# Altium integrated library Connectors.IntLib: 512 symbols (part 1 of 2) (continued)
## PBS-04R
designator CON?  (value not drawn)
2.54mm; Note: Connector; Temp.Characteristic: -40C to +85C; Value: *; Publisher: Catcatcat Electronics; Website developer: http://catcatcat.d-lan.dp.ua/; Assembly type: Manual Part
footprint PBS-04R
pins: 1, 2, 3, 4

## PBS-05
designator CON?  (value not drawn)
2.54mm; Note: Connector; Temp.Characteristic: -40C to +85C; Value: *; Publisher: Catcatcat Electronics; Website developer: http://catcatcat.d-lan.dp.ua/; Assembly type: Manual Part
footprint PBS-05
pins: 1, 2, 3, 4, 5

## PBS-05R
designator CON?  (value not drawn)
2.54mm; Note: Connector; Temp.Characteristic: -40C to +85C; Value: *; Publisher: Catcatcat Electronics; Website developer: http://catcatcat.d-lan.dp.ua/; Assembly type: Manual Part
footprint PBS-05R
pins: 1, 2, 3, 4, 5

## PBS-06
designator CON?  (value not drawn)
2.54mm; Note: Connector; Temp.Characteristic: -40C to +85C; Value: *; Publisher: Catcatcat Electronics; Website developer: http://catcatcat.d-lan.dp.ua/; Assembly type: Manual Part
footprint PBS-06
pins: 1, 2, 3, 4, 5, 6

## PBS-06R
designator CON?  (value not drawn)
2.54mm; Note: Connector; Temp.Characteristic: -40C to +85C; Value: *; Publisher: Catcatcat Electronics; Website developer: http://catcatcat.d-lan.dp.ua/; Assembly type: Manual Part
footprint PBS-06R
pins: 1, 2, 3, 4, 5, 6

## PBS-07
designator CON?  (value not drawn)
2.54mm; Note: Connector; Temp.Characteristic: -40C to +85C; Value: *; Publisher: Catcatcat Electronics; Website developer: http://catcatcat.d-lan.dp.ua/; Assembly type: Manual Part
footprint PBS-07
pins: 1, 2, 3, 4, 5, 6, 7

## PBS-07R
designator CON?  (value not drawn)
2.54mm; Note: Connector; Temp.Characteristic: -40C to +85C; Value: *; Publisher: Catcatcat Electronics; Website developer: http://catcatcat.d-lan.dp.ua/; Assembly type: Manual Part
footprint PBS-07R
pins: 1, 2, 3, 4, 5, 6, 7

## PBS-08
designator CON?  (value not drawn)
2.54mm; Note: Connector; Temp.Characteristic: -40C to +85C; Value: *; Publisher: Catcatcat Electronics; Website developer: http://catcatcat.d-lan.dp.ua/; Assembly type: Manual Part
footprint PBS-08
pins: 1, 2, 3, 4, 5, 6, 7, 8

## PBS-08R
designator CON?  (value not drawn)
2.54mm; Note: Connector; Temp.Characteristic: -40C to +85C; Value: *; Publisher: Catcatcat Electronics; Website developer: http://catcatcat.d-lan.dp.ua/; Assembly type: Manual Part
footprint PBS-08R
pins: 1, 2, 3, 4, 5, 6, 7, 8

## PBS-09
designator CON?  (value not drawn)
2.54mm; Note: Connector; Temp.Characteristic: -40C to +85C; Value: *; Publisher: Catcatcat Electronics; Website developer: http://catcatcat.d-lan.dp.ua/; Assembly type: Manual Part
footprint PBS-09
pins: 1, 2, 3, 4, 5, 6, 7, 8, 9

## PBS-09R
designator CON?  (value not drawn)
2.54mm; Note: Connector; Temp.Characteristic: -40C to +85C; Value: *; Publisher: Catcatcat Electronics; Website developer: http://catcatcat.d-lan.dp.ua/; Assembly type: Manual Part
footprint PBS-09R
pins: 1, 2, 3, 4, 5, 6, 7, 8, 9

## PBS-10
designator CON?  (value not drawn)
2.54mm; Note: Connector; Temp.Characteristic: -40C to +85C; Value: *; Publisher: Catcatcat Electronics; Website developer: http://catcatcat.d-lan.dp.ua/; Assembly type: Manual Part
footprint PBS-10
pins: 1, 2, 3, 4, 5, 6, 7, 8, 9, 10

## PBS-10R
designator CON?  (value not drawn)
2.54mm; Note: Connector; Temp.Characteristic: -40C to +85C; Value: *; Publisher: Catcatcat Electronics; Website developer: http://catcatcat.d-lan.dp.ua/; Assembly type: Manual Part
footprint PBS-10R
pins: 1, 2, 3, 4, 5, 6, 7, 8, 9, 10

## PBSM-1x6
designator CON?  (value not drawn)
2.54 mm; Note: Connector; Temp.Characteristic: -40C to +85C; Value: *; Publisher: Catcatcat Electronics; Website developer: http://catcatcat.d-lan.dp.ua/; Assembly type: Manual Part
footprint PLS-06
pins: 1, 2, 3, 4, 5, 6

## PC-GK2.5/SMD
designator PJ?, comment FC68149S-2.5  (value not drawn)
Note: Connector; Temp.Characteristic: -40C to +85C; Value: *; Publisher: Catcatcat Electronics; Website developer: http://catcatcat.d-lan.dp.ua/; Assembly type: Manual Part
footprint PC-GK2.5/SMD
pins: 1, 2, 3

## PHJACK-7
designator CON?  value {Value}  (hidden comment: PHJACK-7)
Note: Connector; Temp.Characteristic: -40C to +85C; Publisher: Catcatcat Electronics; Website developer: http://catcatcat.d-lan.dp.ua/; Assembly type: Manual Part
footprint PHONEDJACKST
pins: 1, 2, 3, 4, 5, 6, 7

## PHONEDJACKST
designator CON?  value {Value}  (hidden comment: PHONEDJACKST)
Note: Connector; Temp.Characteristic: -40C to +85C; Publisher: Catcatcat Electronics; Website developer: http://catcatcat.d-lan.dp.ua/; Assembly type: Manual Part
footprint PHONEDJACKST
pins: 1, 2, 3, 4, 5

## PJ-002BH-SMT-TR
designator PJ?  (value not drawn)
DC POWER JACK; Manufacturer PartNumber: PJ-002BH-SMT-TR; Note: Connector; Temp.Characteristic: -40C to +85C; Value: *; Publisher: Catcatcat Electronics; HelpURL: https://www.cui.com/product/resource/pj-002bh-smt-tr.pdf; Manufacturer: https://www.cui.com; Website developer: http://catcatcat.d-lan.dp.ua/; Assembly type: Manual Part
footprint PJ-002BH-SMT-TR (Dc Power Jack Connector)
pins: 1A 1, 1B 1, 2, 3

## PJ-313D
designator AJ?
Аудио джек 3.5мм; Note: Connector; Temp.Characteristic: -40C to +85C; Publisher: Catcatcat Electronics; Website developer: http://catcatcat.d-lan.dp.ua/; Assembly type: Manual Part
footprint PJ-313D
pins: 1, 2, 3

## PL2D-02
designator X?  (value not drawn)
2.0 mm; Value: 5*2mm; Pricing Аlternative: 0; Note: Connector; Temp.Characteristic: -40C to +85C; Pricing Digi-Key: 0; Publisher: Catcatcat Electronics; Manufacturer: http://www.jinlingdz.com; Website developer: http://catcatcat.d-lan.dp.ua/; Assembly type: Manual Part
footprint PL2D-02 (2.00 mm)
pins: 1, 2, 3, 4

## PL2D-03
designator X?  (value not drawn)
2.0 mm; Value: 5*2mm; Pricing Аlternative: 0; Note: Connector; Temp.Characteristic: -40C to +85C; Pricing Digi-Key: 0; Publisher: Catcatcat Electronics; Manufacturer: http://www.jinlingdz.com; Website developer: http://catcatcat.d-lan.dp.ua/; Assembly type: Manual Part
footprint PL2D-03 (2.00 mm)
pins: 1, 2, 3, 4, 5, 6

## PL2D-04
designator X?  (value not drawn)
2.0 mm; Value: 5*2mm; Pricing Аlternative: 0; Note: Connector; Temp.Characteristic: -40C to +85C; Pricing Digi-Key: 0; Publisher: Catcatcat Electronics; Manufacturer: http://www.jinlingdz.com; Website developer: http://catcatcat.d-lan.dp.ua/; Assembly type: Manual Part
footprint PL2D-04 (2.00 mm)
pins: 1, 2, 3, 4, 5, 6, 7, 8

## PL2D-05
designator X?  (value not drawn)
2.0 mm; Value: 5*2mm; Pricing Аlternative: 0; Note: Connector; Temp.Characteristic: -40C to +85C; Pricing Digi-Key: 0; Publisher: Catcatcat Electronics; Manufacturer: http://www.jinlingdz.com; Website developer: http://catcatcat.d-lan.dp.ua/; Assembly type: Manual Part
footprint PL2D-05 (2.00 mm)
pins: 1, 2, 3, 4, 5, 6, 7, 8, 9, 10

## PL2D-06
designator X?  (value not drawn)
2.0 mm; Note: Connector; Temp.Characteristic: -40C to +85C; Publisher: Catcatcat Electronics; Manufacturer: http://www.jinlingdz.com; Website developer: http://catcatcat.d-lan.dp.ua/; Assembly type: Manual Part
footprint PL2D-06 (2.00 mm)
pins: 1, 2, 3, 4, 5, 6, 7, 8, 9, 10, 11, 12

## PL2D-08
designator X?  (value not drawn)
2.0 mm; Note: Connector; Temp.Characteristic: -40C to +85C; Publisher: Catcatcat Electronics; Manufacturer: http://www.jinlingdz.com; Website developer: http://catcatcat.d-lan.dp.ua/; Assembly type: Manual Part
footprint PL2D-08 (2.00 mm)
pins: 1, 2, 3, 4, 5, 6, 7, 8, 9, 10, 11, 12, 13, 14, 15, 16

## PL2D-10
designator X?  (value not drawn)
2.0 mm; Note: Connector; Temp.Characteristic: -40C to +85C; Publisher: Catcatcat Electronics; Manufacturer: http://www.jinlingdz.com; Website developer: http://catcatcat.d-lan.dp.ua/; Assembly type: Manual Part
footprint PL2D-10 (2.00 mm)
pins: 1, 2, 3, 4, 5, 6, 7, 8, 9, 10, 11, 12, 13, 14, 15, 16, 17, 18, 19, 20

## PL2D-12
designator X?  (value not drawn)
2.0 mm; Note: Connector; Temp.Characteristic: -40C to +85C; Publisher: Catcatcat Electronics; Manufacturer: http://www.jinlingdz.com; Website developer: http://catcatcat.d-lan.dp.ua/; Assembly type: Manual Part
footprint PL2D-12 (2.00 mm)
pins: 1, 2, 3, 4, 5, 6, 7, 8, 9, 10, 11, 12, 13, 14, 15, 16, 17, 18, 19, 20, 21, 22, 23, 24

## PL2D-14
designator X?  (value not drawn)
2.0 mm; Note: Connector; Temp.Characteristic: -40C to +85C; Publisher: Catcatcat Electronics; Manufacturer: http://www.jinlingdz.com; Website developer: http://catcatcat.d-lan.dp.ua/; Assembly type: Manual Part
footprint PL2D-14 (2.00 mm)
pins: 1, 2, 3, 4, 5, 6, 7, 8, 9, 10, 11, 12, 13, 14, 15, 16, 17, 18, 19, 20, 21, 22, 23, 24, 25, 26, 27, 28

## PL2D-16
designator X?  (value not drawn)
2.0 mm; Note: Connector; Temp.Characteristic: -40C to +85C; Publisher: Catcatcat Electronics; Manufacturer: http://www.jinlingdz.com; Website developer: http://catcatcat.d-lan.dp.ua/; Assembly type: Manual Part
footprint PL2D-16 (2.00 mm)
pins: 1, 2, 3, 4, 5, 6, 7, 8, 9, 10, 11, 12, 13, 14, 15, 16, 17, 18, 19, 20, 21, 22, 23, 24, 25, 26, 27, 28, 29, 30, 31, 32

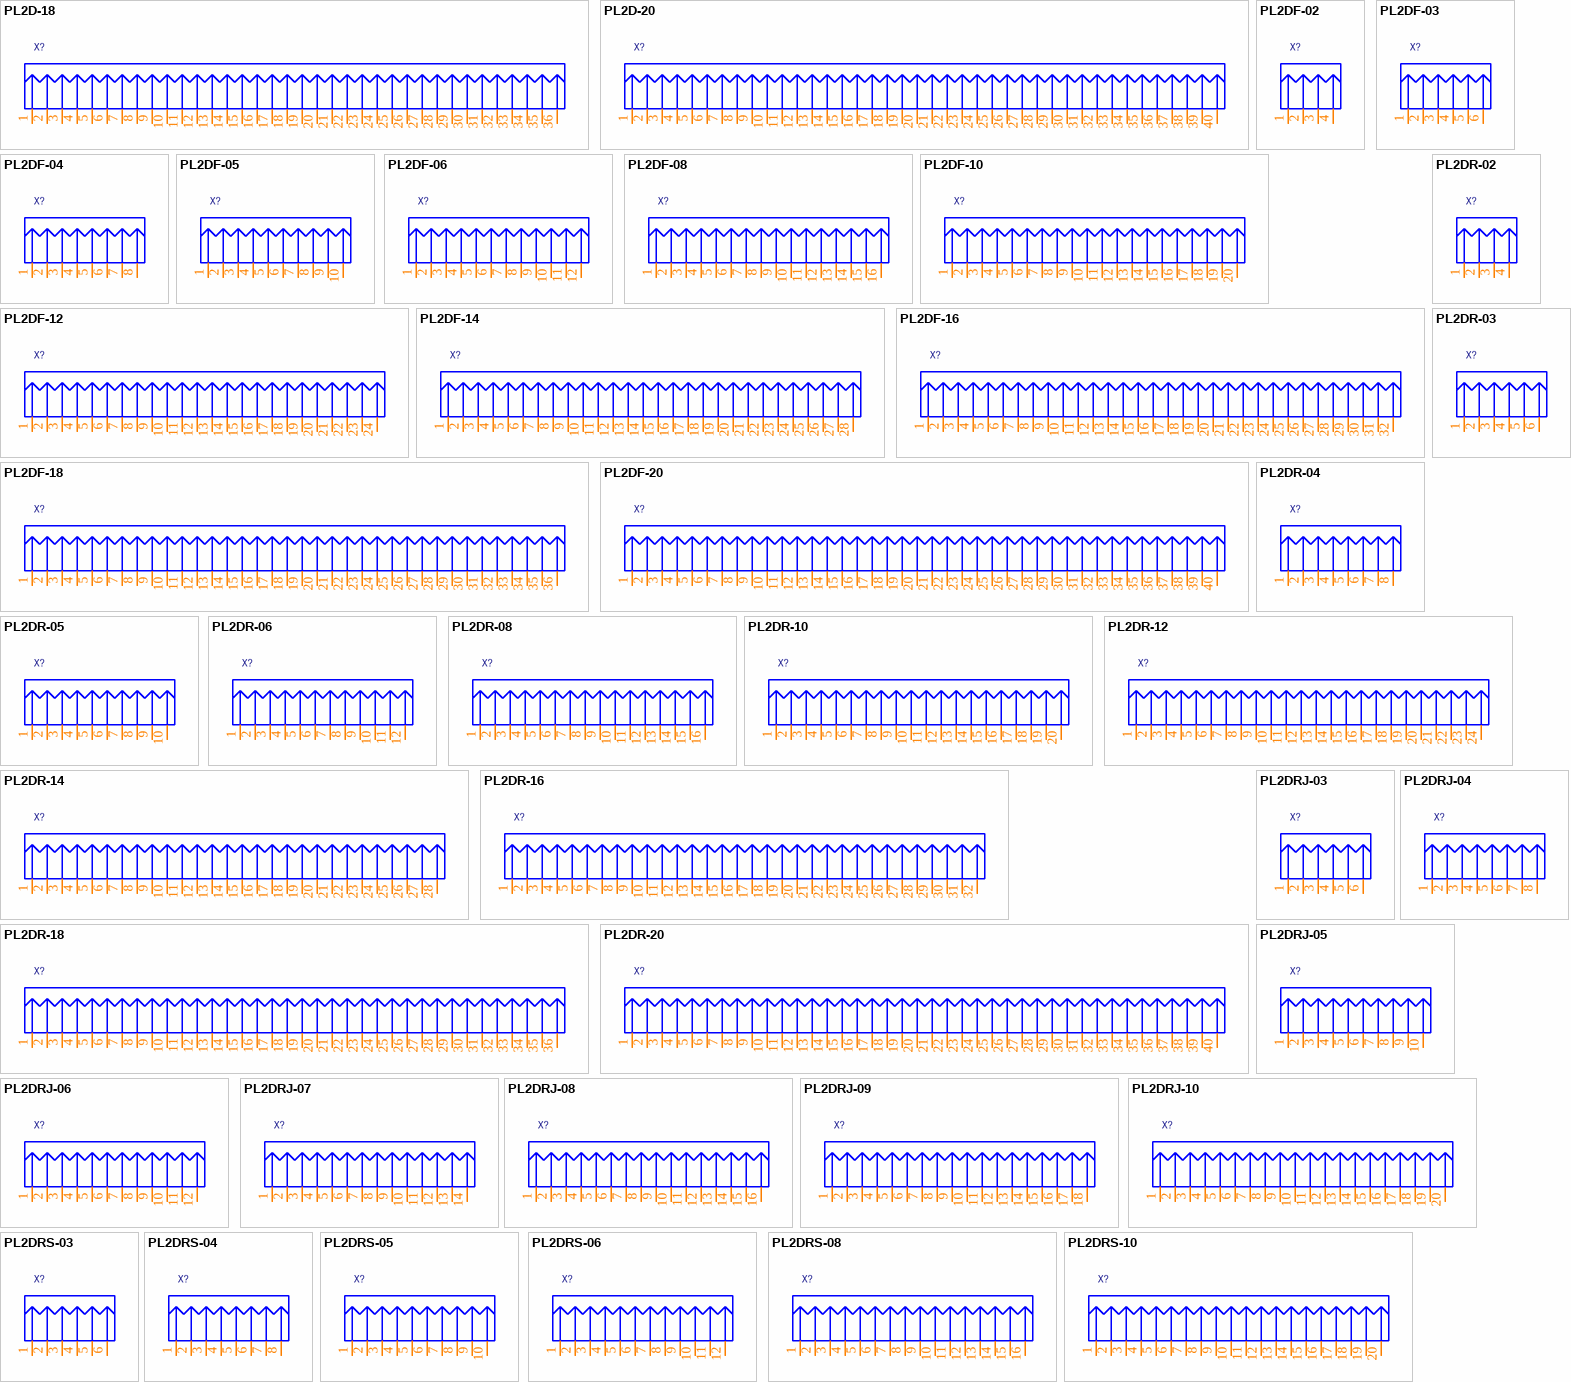
[diagram p6: symbols PL2D-18 to PL2DRS-10]

## PL2D-18
designator X?  (value not drawn)
2.0 mm; Note: Connector; Temp.Characteristic: -40C to +85C; Publisher: Catcatcat Electronics; Manufacturer: http://www.jinlingdz.com; Website developer: http://catcatcat.d-lan.dp.ua/; Assembly type: Manual Part
footprint PL2D-18 (2.00 mm)
pins: 1, 2, 3, 4, 5, 6, 7, 8, 9, 10, 11, 12, 13, 14, 15, 16, 17, 18, 19, 20, 21, 22, 23, 24, 25, 26, 27, 28, 29, 30, 31, 32, 33, 34, 35, 36

## PL2D-20
designator X?  (value not drawn)
2.0 mm; Note: Connector; Temp.Characteristic: -40C to +85C; Publisher: Catcatcat Electronics; Manufacturer: http://www.jinlingdz.com; Website developer: http://catcatcat.d-lan.dp.ua/; Assembly type: Manual Part
footprint PL2D-20 (2.00 mm)
pins: 1, 2, 3, 4, 5, 6, 7, 8, 9, 10, 11, 12, 13, 14, 15, 16, 17, 18, 19, 20, 21, 22, 23, 24, 25, 26, 27, 28, 29, 30, 31, 32, 33, 34, 35, 36, 37, 38, 39, 40

## PL2DF-02
designator X?  (value not drawn)
2.0 mm; Value: 5*2mm; Pricing Аlternative: 0; Note: Connector; Temp.Characteristic: -40C to +85C; Pricing Digi-Key: 0; Publisher: Catcatcat Electronics; Manufacturer: http://www.jinlingdz.com; Website developer: http://catcatcat.d-lan.dp.ua/; Assembly type: Manual Part
footprint PL2DF-02 (2.00 mm)
pins: 1, 2, 3, 4

## PL2DF-03
designator X?  (value not drawn)
2.0 mm; Value: 5*2mm; Pricing Аlternative: 0; Note: Connector; Temp.Characteristic: -40C to +85C; Pricing Digi-Key: 0; Publisher: Catcatcat Electronics; Manufacturer: http://www.jinlingdz.com; Website developer: http://catcatcat.d-lan.dp.ua/; Assembly type: Manual Part
footprint PL2DF-03 (2.00 mm)
pins: 1, 2, 3, 4, 5, 6

## PL2DF-04
designator X?  (value not drawn)
2.0 mm; Value: 5*2mm; Pricing Аlternative: 0; Note: Connector; Temp.Characteristic: -40C to +85C; Pricing Digi-Key: 0; Publisher: Catcatcat Electronics; Manufacturer: http://www.jinlingdz.com; Website developer: http://catcatcat.d-lan.dp.ua/; Assembly type: Manual Part
footprint PL2DF-04 (2.00 mm)
pins: 1, 2, 3, 4, 5, 6, 7, 8

## PL2DF-05
designator X?  (value not drawn)
2.0 mm; Value: 5*2mm; Pricing Аlternative: 0; Note: Connector; Temp.Characteristic: -40C to +85C; Pricing Digi-Key: 0; Publisher: Catcatcat Electronics; Manufacturer: http://www.jinlingdz.com; Website developer: http://catcatcat.d-lan.dp.ua/; Assembly type: Manual Part
footprint PL2DF-05 (2.00 mm)
pins: 1, 2, 3, 4, 5, 6, 7, 8, 9, 10

## PL2DF-06
designator X?  (value not drawn)
2.0 mm; Note: Connector; Temp.Characteristic: -40C to +85C; Publisher: Catcatcat Electronics; Manufacturer: http://www.jinlingdz.com; Website developer: http://catcatcat.d-lan.dp.ua/; Assembly type: Manual Part
footprint PL2DF-06 (2.00 mm)
pins: 1, 2, 3, 4, 5, 6, 7, 8, 9, 10, 11, 12

## PL2DF-08
designator X?  (value not drawn)
2.0 mm; Note: Connector; Temp.Characteristic: -40C to +85C; Publisher: Catcatcat Electronics; Manufacturer: http://www.jinlingdz.com; Website developer: http://catcatcat.d-lan.dp.ua/; Assembly type: Manual Part
footprint PL2DF-08 (2.00 mm)
pins: 1, 2, 3, 4, 5, 6, 7, 8, 9, 10, 11, 12, 13, 14, 15, 16

## PL2DF-10
designator X?  (value not drawn)
2.0 mm; Note: Connector; Temp.Characteristic: -40C to +85C; Publisher: Catcatcat Electronics; Manufacturer: http://www.jinlingdz.com; Website developer: http://catcatcat.d-lan.dp.ua/; Assembly type: Manual Part
footprint PL2DF-10 (2.00 mm)
pins: 1, 2, 3, 4, 5, 6, 7, 8, 9, 10, 11, 12, 13, 14, 15, 16, 17, 18, 19, 20

## PL2DF-12
designator X?  (value not drawn)
2.0 mm; Note: Connector; Temp.Characteristic: -40C to +85C; Publisher: Catcatcat Electronics; Manufacturer: http://www.jinlingdz.com; Website developer: http://catcatcat.d-lan.dp.ua/; Assembly type: Manual Part
footprint PL2DF-12 (2.00 mm)
pins: 1, 2, 3, 4, 5, 6, 7, 8, 9, 10, 11, 12, 13, 14, 15, 16, 17, 18, 19, 20, 21, 22, 23, 24

## PL2DF-14
designator X?  (value not drawn)
2.0 mm; Note: Connector; Temp.Characteristic: -40C to +85C; Publisher: Catcatcat Electronics; Manufacturer: http://www.jinlingdz.com; Website developer: http://catcatcat.d-lan.dp.ua/; Assembly type: Manual Part
footprint PL2DF-14 (2.00 mm)
pins: 1, 2, 3, 4, 5, 6, 7, 8, 9, 10, 11, 12, 13, 14, 15, 16, 17, 18, 19, 20, 21, 22, 23, 24, 25, 26, 27, 28

## PL2DF-16
designator X?  (value not drawn)
2.0 mm; Note: Connector; Temp.Characteristic: -40C to +85C; Publisher: Catcatcat Electronics; Manufacturer: http://www.jinlingdz.com; Website developer: http://catcatcat.d-lan.dp.ua/; Assembly type: Manual Part
footprint PL2DF-16 (2.00 mm)
pins: 1, 2, 3, 4, 5, 6, 7, 8, 9, 10, 11, 12, 13, 14, 15, 16, 17, 18, 19, 20, 21, 22, 23, 24, 25, 26, 27, 28, 29, 30, 31, 32

## PL2DF-18
designator X?  (value not drawn)
2.0 mm; Note: Connector; Temp.Characteristic: -40C to +85C; Publisher: Catcatcat Electronics; Manufacturer: http://www.jinlingdz.com; Website developer: http://catcatcat.d-lan.dp.ua/; Assembly type: Manual Part
footprint PL2DF-18 (Footprint not found)
pins: 1, 2, 3, 4, 5, 6, 7, 8, 9, 10, 11, 12, 13, 14, 15, 16, 17, 18, 19, 20, 21, 22, 23, 24, 25, 26, 27, 28, 29, 30, 31, 32, 33, 34, 35, 36

## PL2DF-20
designator X?  (value not drawn)
2.0 mm; Note: Connector; Temp.Characteristic: -40C to +85C; Publisher: Catcatcat Electronics; Manufacturer: http://www.jinlingdz.com; Website developer: http://catcatcat.d-lan.dp.ua/; Assembly type: Manual Part
footprint PL2DF-20 (2.00 mm)
pins: 1, 2, 3, 4, 5, 6, 7, 8, 9, 10, 11, 12, 13, 14, 15, 16, 17, 18, 19, 20, 21, 22, 23, 24, 25, 26, 27, 28, 29, 30, 31, 32, 33, 34, 35, 36, 37, 38, 39, 40

## PL2DR-02
designator X?  (value not drawn)
2.0 mm; Value: 5*2mm; Pricing Аlternative: 0; Note: Connector; Temp.Characteristic: -40C to +85C; Pricing Digi-Key: 0; Publisher: Catcatcat Electronics; Manufacturer: http://www.jinlingdz.com; Website developer: http://catcatcat.d-lan.dp.ua/; Assembly type: Manual Part
footprint PL2DR-02 (Footprint not found)
pins: 1, 2, 3, 4

## PL2DR-03
designator X?  (value not drawn)
2.0 mm; Value: 5*2mm; Pricing Аlternative: 0; Note: Connector; Temp.Characteristic: -40C to +85C; Pricing Digi-Key: 0; Publisher: Catcatcat Electronics; Manufacturer: http://www.jinlingdz.com; Website developer: http://catcatcat.d-lan.dp.ua/; Assembly type: Manual Part
footprint PL2DR-03 (2.00 mm)
pins: 1, 2, 3, 4, 5, 6

## PL2DR-04
designator X?  (value not drawn)
2.0 mm; Value: 5*2mm; Pricing Аlternative: 0; Note: Connector; Temp.Characteristic: -40C to +85C; Pricing Digi-Key: 0; Publisher: Catcatcat Electronics; Manufacturer: http://www.jinlingdz.com; Website developer: http://catcatcat.d-lan.dp.ua/; Assembly type: Manual Part
footprint PL2DR-04 (2.00 mm)
pins: 1, 2, 3, 4, 5, 6, 7, 8

## PL2DR-05
designator X?  (value not drawn)
2.0 mm; Value: 5*2mm; Pricing Аlternative: 0; Note: Connector; Temp.Characteristic: -40C to +85C; Pricing Digi-Key: 0; Publisher: Catcatcat Electronics; Manufacturer: http://www.jinlingdz.com; Website developer: http://catcatcat.d-lan.dp.ua/; Assembly type: Manual Part
footprint PL2DR-05 (2.00 mm)
pins: 1, 2, 3, 4, 5, 6, 7, 8, 9, 10

## PL2DR-06
designator X?  (value not drawn)
2.0 mm; Note: Connector; Temp.Characteristic: -40C to +85C; Publisher: Catcatcat Electronics; Manufacturer: http://www.jinlingdz.com; Website developer: http://catcatcat.d-lan.dp.ua/; Assembly type: Manual Part
footprint PL2DR-06 (2.00 mm)
pins: 1, 2, 3, 4, 5, 6, 7, 8, 9, 10, 11, 12

## PL2DR-08
designator X?  (value not drawn)
2.0 mm; Note: Connector; Temp.Characteristic: -40C to +85C; Publisher: Catcatcat Electronics; Manufacturer: http://www.jinlingdz.com; Website developer: http://catcatcat.d-lan.dp.ua/; Assembly type: Manual Part
footprint PL2DR-08 (2.00 mm)
pins: 1, 2, 3, 4, 5, 6, 7, 8, 9, 10, 11, 12, 13, 14, 15, 16

## PL2DR-10
designator X?  (value not drawn)
2.0 mm; Note: Connector; Temp.Characteristic: -40C to +85C; Publisher: Catcatcat Electronics; Manufacturer: http://www.jinlingdz.com; Website developer: http://catcatcat.d-lan.dp.ua/; Assembly type: Manual Part
footprint PL2DR-10 (2.00 mm)
pins: 1, 2, 3, 4, 5, 6, 7, 8, 9, 10, 11, 12, 13, 14, 15, 16, 17, 18, 19, 20

## PL2DR-12
designator X?  (value not drawn)
2.0 mm; Note: Connector; Temp.Characteristic: -40C to +85C; Publisher: Catcatcat Electronics; Manufacturer: http://www.jinlingdz.com; Website developer: http://catcatcat.d-lan.dp.ua/; Assembly type: Manual Part
footprint PL2DR-12 (2.00 mm)
pins: 1, 2, 3, 4, 5, 6, 7, 8, 9, 10, 11, 12, 13, 14, 15, 16, 17, 18, 19, 20, 21, 22, 23, 24

## PL2DR-14
designator X?  (value not drawn)
2.0 mm; Note: Connector; Temp.Characteristic: -40C to +85C; Publisher: Catcatcat Electronics; Manufacturer: http://www.jinlingdz.com; Website developer: http://catcatcat.d-lan.dp.ua/; Assembly type: Manual Part
footprint PL2DR-14 (2.00 mm)
pins: 1, 2, 3, 4, 5, 6, 7, 8, 9, 10, 11, 12, 13, 14, 15, 16, 17, 18, 19, 20, 21, 22, 23, 24, 25, 26, 27, 28

## PL2DR-16
designator X?  (value not drawn)
2.0 mm; Note: Connector; Temp.Characteristic: -40C to +85C; Publisher: Catcatcat Electronics; Manufacturer: http://www.jinlingdz.com; Website developer: http://catcatcat.d-lan.dp.ua/; Assembly type: Manual Part
footprint PL2DR-16 (2.00 mm)
pins: 1, 2, 3, 4, 5, 6, 7, 8, 9, 10, 11, 12, 13, 14, 15, 16, 17, 18, 19, 20, 21, 22, 23, 24, 25, 26, 27, 28, 29, 30, 31, 32

## PL2DR-18
designator X?  (value not drawn)
2.0 mm; Note: Connector; Temp.Characteristic: -40C to +85C; Publisher: Catcatcat Electronics; Manufacturer: http://www.jinlingdz.com; Website developer: http://catcatcat.d-lan.dp.ua/; Assembly type: Manual Part
footprint PL2DR-18 (2.00 mm)
pins: 1, 2, 3, 4, 5, 6, 7, 8, 9, 10, 11, 12, 13, 14, 15, 16, 17, 18, 19, 20, 21, 22, 23, 24, 25, 26, 27, 28, 29, 30, 31, 32, 33, 34, 35, 36

## PL2DR-20
designator X?  (value not drawn)
2.0 mm; Note: Connector; Temp.Characteristic: -40C to +85C; Publisher: Catcatcat Electronics; Manufacturer: http://www.jinlingdz.com; Website developer: http://catcatcat.d-lan.dp.ua/; Assembly type: Manual Part
footprint PL2DR-20 (2.00 mm)
pins: 1, 2, 3, 4, 5, 6, 7, 8, 9, 10, 11, 12, 13, 14, 15, 16, 17, 18, 19, 20, 21, 22, 23, 24, 25, 26, 27, 28, 29, 30, 31, 32, 33, 34, 35, 36, 37, 38, 39, 40

## PL2DRJ-03
designator X?  (value not drawn)
2.0 mm; Value: 5*2mm; Pricing Аlternative: 0; Note: Connector; Temp.Characteristic: -40C to +85C; Pricing Digi-Key: 0; Publisher: Catcatcat Electronics; Manufacturer: http://www.jinlingdz.com; Website developer: http://catcatcat.d-lan.dp.ua/; Assembly type: Manual Part
footprint PL2DRJ-03 - 2349 (2349 1 06 GO)
pins: 1, 2, 3, 4, 5, 6

## PL2DRJ-04
designator X?  (value not drawn)
2.0 mm; Value: 5*2mm; Pricing Аlternative: 0; Note: Connector; Temp.Characteristic: -40C to +85C; Pricing Digi-Key: 0; Publisher: Catcatcat Electronics; Manufacturer: http://www.jinlingdz.com; Website developer: http://catcatcat.d-lan.dp.ua/; Assembly type: Manual Part
footprint PL2DRJ-04 - 2349 (2.00 mm)
pins: 1, 2, 3, 4, 5, 6, 7, 8

## PL2DRJ-05
designator X?  (value not drawn)
2.0 mm; Value: 5*2mm; Pricing Аlternative: 0; Note: Connector; Temp.Characteristic: -40C to +85C; Pricing Digi-Key: 0; Publisher: Catcatcat Electronics; Manufacturer: http://www.jinlingdz.com; Website developer: http://catcatcat.d-lan.dp.ua/; Assembly type: Manual Part
footprint PL2DRJ-05 - 2349 (2.00 mm)
pins: 1, 2, 3, 4, 5, 6, 7, 8, 9, 10

## PL2DRJ-06
designator X?  (value not drawn)
2.0 mm; Note: Connector; Temp.Characteristic: -40C to +85C; Publisher: Catcatcat Electronics; Manufacturer: http://www.jinlingdz.com; Website developer: http://catcatcat.d-lan.dp.ua/; Assembly type: Manual Part
footprint PL2DRJ-06 - 2349 (2.00 mm)
pins: 1, 2, 3, 4, 5, 6, 7, 8, 9, 10, 11, 12

## PL2DRJ-07
designator X?  (value not drawn)
2.0 mm; Note: Connector; Temp.Characteristic: -40C to +85C; Publisher: Catcatcat Electronics; Manufacturer: http://www.jinlingdz.com; Website developer: http://catcatcat.d-lan.dp.ua/; Assembly type: Manual Part
footprint PL2DRJ-07 - 2349 (2.00 mm)
pins: 1, 2, 3, 4, 5, 6, 7, 8, 9, 10, 11, 12, 13, 14

## PL2DRJ-08
designator X?  (value not drawn)
2.0 mm; Note: Connector; Temp.Characteristic: -40C to +85C; Publisher: Catcatcat Electronics; Manufacturer: http://www.jinlingdz.com; Website developer: http://catcatcat.d-lan.dp.ua/; Assembly type: Manual Part
footprint PL2DRJ-08 - 2349 (2.00 mm)
pins: 1, 2, 3, 4, 5, 6, 7, 8, 9, 10, 11, 12, 13, 14, 15, 16

## PL2DRJ-09
designator X?  (value not drawn)
2.0 mm; Note: Connector; Temp.Characteristic: -40C to +85C; Publisher: Catcatcat Electronics; Manufacturer: http://www.jinlingdz.com; Website developer: http://catcatcat.d-lan.dp.ua/; Assembly type: Manual Part
footprint PL2DRJ-09 - 2349 (2.00 mm)
pins: 1, 2, 3, 4, 5, 6, 7, 8, 9, 10, 11, 12, 13, 14, 15, 16, 17, 18

## PL2DRJ-10
designator X?  (value not drawn)
2.0 mm; Note: Connector; Temp.Characteristic: -40C to +85C; Publisher: Catcatcat Electronics; Manufacturer: http://www.jinlingdz.com; Website developer: http://catcatcat.d-lan.dp.ua/; Assembly type: Manual Part
footprint PL2DRJ-10 - 2349 (2.00 mm)
pins: 1, 2, 3, 4, 5, 6, 7, 8, 9, 10, 11, 12, 13, 14, 15, 16, 17, 18, 19, 20

## PL2DRS-03
designator X?  (value not drawn)
2.0 mm; Value: 5*2mm; Pricing Аlternative: 0; Note: Connector; Temp.Characteristic: -40C to +85C; Pricing Digi-Key: 0; Publisher: Catcatcat Electronics; Manufacturer: http://www.jinlingdz.com; Website developer: http://catcatcat.d-lan.dp.ua/; Assembly type: Manual Part
footprint PL2DRS-03 (2.00 mm)
pins: 1, 2, 3, 4, 5, 6

## PL2DRS-04
designator X?  (value not drawn)
2.0 mm; Value: 5*2mm; Pricing Аlternative: 0; Note: Connector; Temp.Characteristic: -40C to +85C; Pricing Digi-Key: 0; Publisher: Catcatcat Electronics; Manufacturer: http://www.jinlingdz.com; Website developer: http://catcatcat.d-lan.dp.ua/; Assembly type: Manual Part
footprint PL2DRS-04 (2.00 mm)
pins: 1, 2, 3, 4, 5, 6, 7, 8

## PL2DRS-05
designator X?  (value not drawn)
2.0 mm; Value: 5*2mm; Pricing Аlternative: 0; Note: Connector; Temp.Characteristic: -40C to +85C; Pricing Digi-Key: 0; Publisher: Catcatcat Electronics; Manufacturer: http://www.jinlingdz.com; Website developer: http://catcatcat.d-lan.dp.ua/; Assembly type: Manual Part
footprint PL2DRS-05 (2.00 mm)
pins: 1, 2, 3, 4, 5, 6, 7, 8, 9, 10

## PL2DRS-06
designator X?  (value not drawn)
2.0 mm; Note: Connector; Temp.Characteristic: -40C to +85C; Publisher: Catcatcat Electronics; Manufacturer: http://www.jinlingdz.com; Website developer: http://catcatcat.d-lan.dp.ua/; Assembly type: Manual Part
footprint PL2DRS-06 (2.00 mm)
pins: 1, 2, 3, 4, 5, 6, 7, 8, 9, 10, 11, 12